# Altium footprint library ICL_passives_v1.PcbLib: 102 footprints (part 4 of 7)
Each footprint in its own frame and in the unit in brackets; x right, y up, seen from the top. Pads: shape width x height; smd on the part's side, far side on the other; paste and mask are expansions set on the pad; w line width, h text height; cw(c..) or ccw(c..) is an arc to the next point about the centre after c.
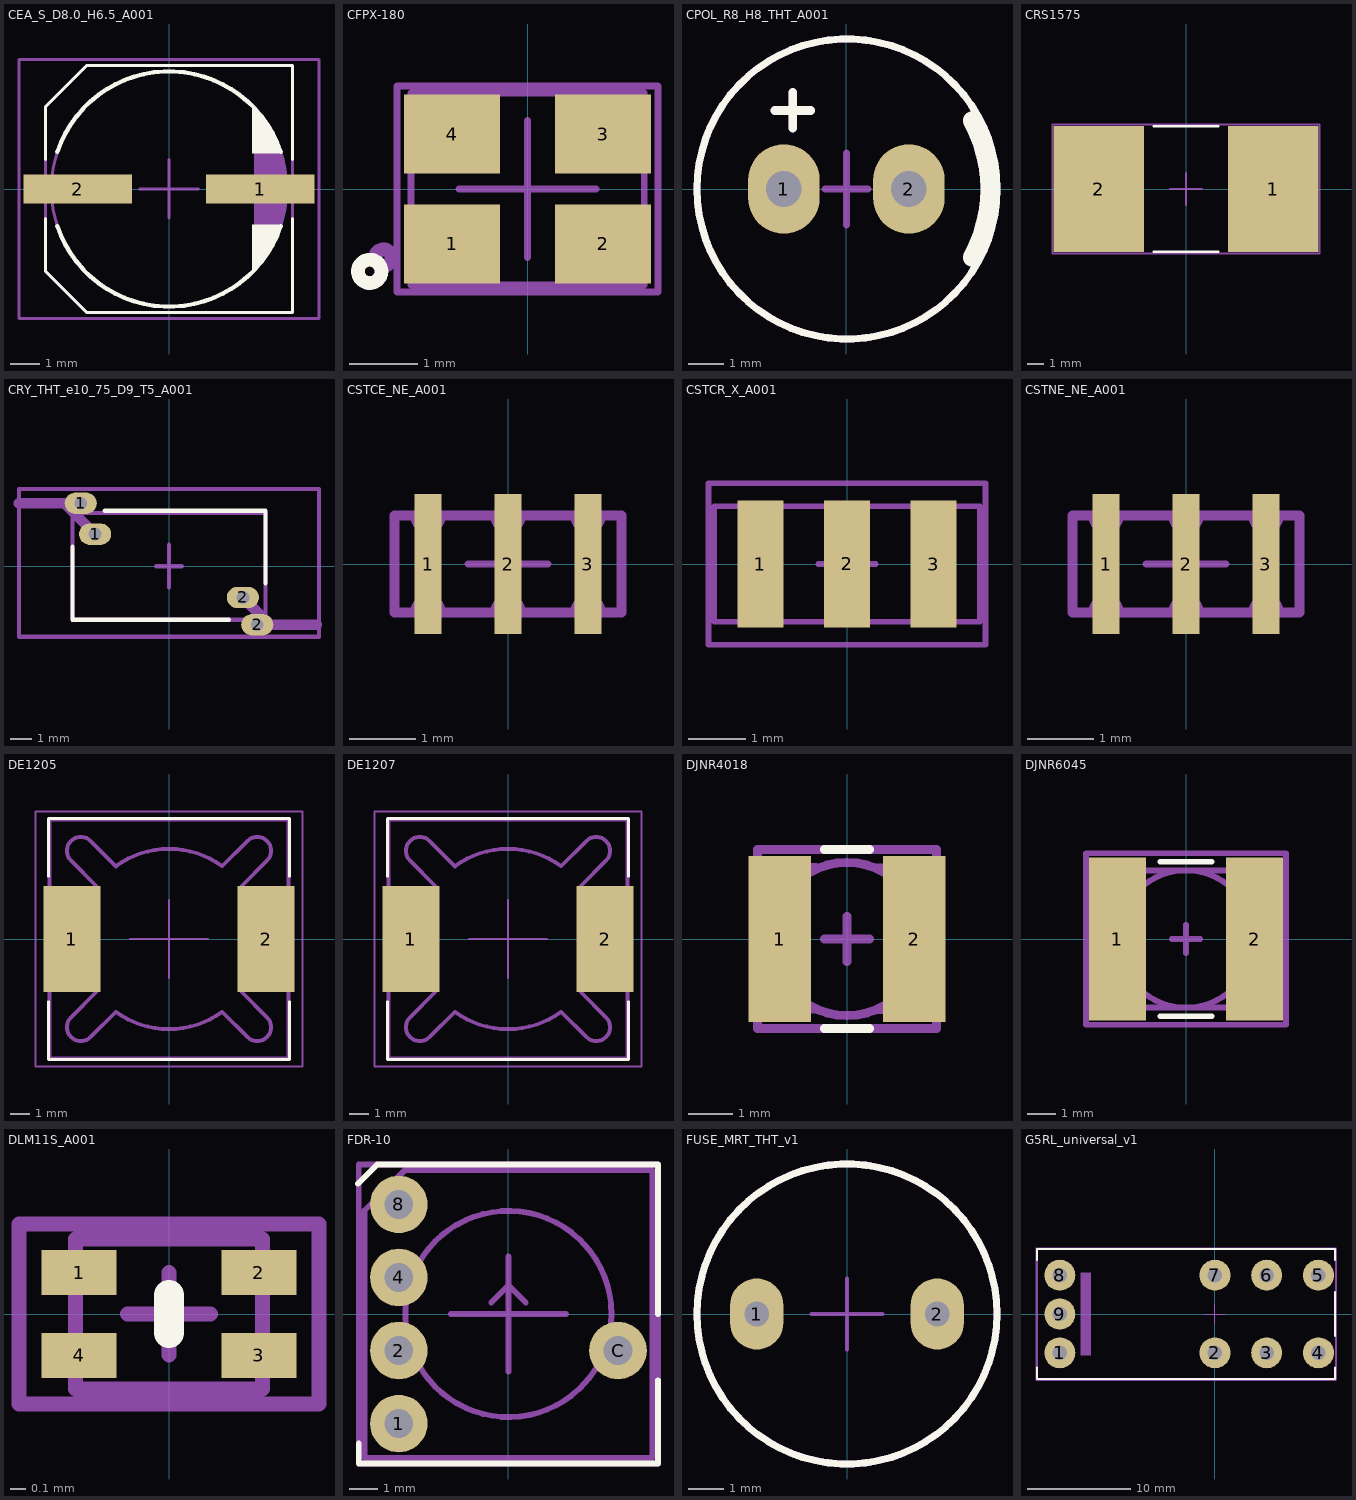
[diagram p3: the footprints below, top view; thin cyan lines are the x and y axes]

## CEA_S_D8.0_H6.5_A001 [mm]
pads (2):
  rect 3.7x1 smd: 1(3.1,0) 2(-3.1,0)
Top Overlay:
  region: 2.825,-2.827 3.346,-2.221 3.392,-2.176 3.475,-2.078 3.549,-1.973 3.611,-1.861 3.637,-1.802 3.677,-1.735 3.741,-1.591 3.789,-1.442 3.821,-1.289 3.828,-1.211 2.825,-1.211 2.825,-1.335
  region: 2.83,2.832 3.298,2.298 3.386,2.196 3.539,1.976 3.669,1.74 3.773,1.492 3.811,1.363 3.813,1.345 3.816,1.307 3.817,1.269 3.817,1.232 3.816,1.213 2.83,1.213
  lines w0.1: -4.2,-1 -4.2,-2.8 -2.8,-4.2 4.2,-4.2 4.2,-1 ; -4.2,1 -4.2,2.8 -2.8,4.2 4.2,4.2 4.2,1
  lines w0.15: -3.795,-1.265 ccw(c0,0) 3.795,-1.265 ; -3.795,1.265 cw(c0,0) 3.795,1.265
Top M11-12_SMOT:
  circle w0.1: c0,0 r4
  rectangle: -4.8,-0.4 -4.2,0.417
  region: 4.8,0.417 3.833,0.417 3.833,-0.416 4.8,-0.416
  region: 2.9,2.8 3.256,2.3 3.342,2.204 3.493,1.997 3.623,1.777 3.731,1.544 3.774,1.423 3.828,1.296 3.911,1.032 3.968,0.761 3.998,0.486 4,0.348 4,-0.148 4.005,-0.282 3.99,-0.55 3.948,-0.815 3.88,-1.075 3.833,-1.201 3.792,-1.337 3.683,-1.601 3.549,-1.852 3.39,-2.09 3.3,-2.2 2.9,-2.7
  lines w0.1: -4.2,-2.8 -2.8,-4.2 4.2,-4.2 4.2,4.2 -2.8,4.2 -4.2,2.8 -4.2,-2.8
Top M13-14_SDES:
  text "'.Designator'" at 0.417,-5.665 h1
Top M15-16_SORG:
  lines w0.1: -0.995,0 0.005,0 ; 0,-0.989 0,0.011 ; 0,0 1,0 ; 0.003,0.008 0.003,1.008 ; -5.1,-4.4 5.1,-4.4 5.1,4.4 -5.1,4.4 -5.1,-4.4
3D body "CEA_S_D8_H6_5_A001.stp": height 6.52, standoff 0.01, extent -4.95,-4.15 4.95,4.15

## CFPX-180 [mm] "kwarc"
pads (4):
  rect 1.4x1.15 smd: 1(-1.1,-0.8) 2(1.1,-0.8) 3(1.1,0.8) 4(-1.1,0.8)
Top Overlay:
  circle w0.2: c-2.3,-1.2 r0.17
Top M11-12_SMOT:
  circle w0.2: c-2.1,-1 r0.12
  rectangle: 0.7,0.5 1.7,1.4
  region: 1.7,-0.5 0.7,-0.5 0.7,-1.4 1.7,-1.4
  rectangle: -1.7,0.5 -0.7,1.4
  region: -0.7,-0.5 -1.7,-0.5 -1.7,-1.4 -0.7,-1.4
  lines w0.1: -1.7,-1.4 1.7,-1.4 1.7,1.4 -1.7,1.4 -1.7,-1.4
Top M13-14_SDES:
  text "'.Designator'" at -4.532,1.967 h0.8
Top M15-16_SORG:
  lines w0.1: -1,0 0,0 ; 0,-1 0,0 ; 0,1 0,0 ; 1,0 0,0 ; -1.9,-1.5 1.9,-1.5 1.9,1.5 -1.9,1.5 -1.9,-1.5
3D body: height 0.6, standoff 0, extent -1.7,-1.4 1.7,1.4
3D body: height 0.8, standoff 0.6, extent -1.6,-1.3 1.6,1.3

## CPOL_R8_H8_THT_A001 [mm] "polimer l=8.0mm fi= 8mm e=3.5"
pads (2):
  oval 2x2.5 hole 1: 1(-1.75,0) 2(1.75,0)
Top Overlay:
  circle w0.2: c0.018,0 r4.2
  lines w0.25: -2,2.2 -1,2.2 ; -1.5,1.7 -1.5,2.7
  lines w0.5: 3.512,-1.915 ccw(c0,0) 3.512,1.915
Top M15-16_SORG:
  lines w0.2: -0.6,0 0.6,0 ; 0,-1 0,1
Top M17-18_TDES:
  text "'.Designator'" at 0.417,-5.665 h1
Top M19-20_TMOT:
  circle w0.2: c0.018,0 r4.2
  lines w0.25: -2,2.2 -1,2.2 ; -1.5,1.7 -1.5,2.7
  lines w0.5: 3.512,-1.915 ccw(c0,0) 3.512,1.915
3D body "CPOL_R8_H8_THT_A001.stp": height 9.01, standoff -2.49, extent -4.25,-4.25 4.25,4.245

## CRS1575 [mm]
pads (2):
  rect 5.6x7.8 smd: 1(5.4,0) 2(-5.4,0)
Top Overlay:
  lines w0.152: -2,-3.9 2,-3.9 ; -2,3.9 2,3.9
Top M11-12_SMOT:
  lines w0.1: -8.3,-4 -8.3,4 8.3,4 8.3,-4 -8.3,-4
Top M13-14_SDES:
  text "'.Designator'" at 0.417,-5.665 h1
Top M15-16_SORG:
  lines w0.1: -0.995,0 0.005,0 ; 0,-0.989 0,0.011 ; 0,0 1,0 ; 0.003,0.008 0.003,1.008 ; -8.3,-4 -8.3,4 8.3,4 8.3,-4 -8.3,-4
3D body "CRS1575.stp": height 1.81, standoff 0.01, extent -7.6,-3.75 7.6,3.75

## CRY_THT_e10_75_D9_T5_A001 [mm] "cr e=7.5-10 D=7.5 T=4 THT"
pads (4):
  oval 1.5x1 hole 0.6: 1(-4.119,2.935) 1(-3.447,1.493) 2(3.447,-1.462) 2(4.119,-2.735)
Top Overlay:
  lines w0.2: -4.5,0.9 -4.5,-2.5 2.8,-2.5 ; -3,2.581 4.5,2.581 4.5,-0.8
Top M15-16_SORG:
  lines w0.2: -0.6,0 0.6,0 ; 0,-1 0,1 ; -7,-3.3 -7,3.6 7,3.6 7,-0.8 7,-3.3 -7,-3.3
Top M17-18_TDES:
  text "'.Designator'" at -5.165,-0.517 h1
Top M19-20_TMOT:
  circle w0.35: c3.447,-1.462 r0.2
  circle w0.35: c-3.447,1.493 r0.2
  circle w0.35: c4.119,-2.735 r0.2
  circle w0.35: c-4.119,2.935 r0.2
  lines w0.2: -4.5,-2.5 4.5,-2.5 4.5,2.482 -4.5,2.482 -4.5,-2.5
  lines w0.5: -4.119,2.935 -7,2.935 -4.889,2.935 -3.447,1.493 ; 3.447,-1.462 4.72,-2.735 6.9,-2.735 4.119,-2.735
3D body "e=75.stp": height 7.35, standoff -2.49, extent -3.861,-2.485 3.862,2.52
3D body "e=10mm.stp": height 11.99, standoff -2.5, extent -6.942,-3.335 6.942,3.535

## CSTCE_NE_A001 [mm] "Murata ceramic resonator e=1,2mm"
pads (3):
  rect 0.4x2.1 smd: 1(-1.2,0) 2(0,0) 3(1.2,0)
Top M11-12_SMOT:
  lines w0.1: -1.409,-0.689 cw(c-1.2,-0.71) -0.991,-0.69 ; -1.409,0.69 ccw(c-1.2,0.71) -0.991,0.689 ; -0.209,-0.689 cw(c0,-0.71) 0.209,-0.69 ; -0.209,0.69 ccw(c0,0.71) 0.209,0.689 ; 0.991,-0.689 cw(c1.2,-0.71) 1.409,-0.69 ; 0.991,0.69 ccw(c1.2,0.71) 1.409,0.689
  lines w0.15: -1.7,0.71 -1.7,-0.73 1.7,-0.73 1.7,0.73 -1.7,0.73
Top M13-14_SDES:
  text "'.Designator'" at -3.399,-0.25 h0.6
Top M15-16_SORG:
  lines w0.05: -1.7,0.71 -1.7,-0.73 1.7,-0.73 1.7,0.73 -1.7,0.73
  lines w0.1: -0.6,0 0,0 ; 0,-0.6 0,0 ; 0,0.6 0,0 ; 0.6,0 0,0
3D body: height 0.4, standoff 0, extent -1.7,-0.7 1.7,0.7
3D body: height 0.7, standoff 0.4, extent -1.5,-0.5 1.5,0.5

## CSTCR_X_A001 [mm]
height 0.381
pads (3):
  rect 0.8x2.2 smd: 1(-1.5,0) 2(0,0) 3(1.5,0)
Top M11-12_SMOT:
  lines w0.1: -2.3,-1 -2.3,1 2.3,1 2.3,-1 -2.3,-1
Top M13-14_SDES:
  text "'.Designator'" at -3.399,1.65 h0.6
Top M15-16_SORG:
  lines w0.1: -0.5,0 0.5,0 ; 0,-0.5 0,0.5 ; -2.4,-1.4 -2.4,1.4 2.4,1.4 2.4,-1.4 -2.4,-1.4
3D body: height 0.4, standoff 0.01, extent -2.3,-1 2.3,1
3D body: height 1.15, standoff 0.4, extent -2.1,-0.7 2.1,0.7

## CSTNE_NE_A001 [mm] "Murata ceramic resonator e=1,2mm"
pads (3):
  rect 0.4x2.1 smd: 1(-1.2,0) 2(0,0) 3(1.2,0)
Top M11-12_SMOT:
  lines w0.1: -1.409,-0.689 cw(c-1.2,-0.71) -0.991,-0.69 ; -1.409,0.69 ccw(c-1.2,0.71) -0.991,0.689 ; -0.209,-0.689 cw(c0,-0.71) 0.209,-0.69 ; -0.209,0.69 ccw(c0,0.71) 0.209,0.689 ; 0.991,-0.689 cw(c1.2,-0.71) 1.409,-0.69 ; 0.991,0.69 ccw(c1.2,0.71) 1.409,0.689
  lines w0.15: -1.7,0.71 -1.7,-0.73 1.7,-0.73 1.7,0.73 -1.7,0.73
Top M13-14_SDES:
  text "'.Designator'" at -3.399,-0.25 h0.6
Top M15-16_SORG:
  lines w0.05: -1.7,0.71 -1.7,-0.73 1.7,-0.73 1.7,0.73 -1.7,0.73
  lines w0.1: -0.6,0 0,0 ; 0,-0.6 0,0 ; 0,0.6 0,0 ; 0.6,0 0,0
3D body: height 0.4, standoff 0, extent -1.7,-0.7 1.7,0.7
3D body: height 0.7, standoff 0.4, extent -1.5,-0.5 1.5,0.5

## DE1205 [mm]
pads (2):
  rect 2.9x5.4 smd: 1(-4.95,0) 2(4.95,0)
Top Overlay:
  lines w0.152: -6.15,-3.2 -6.15,-6.15 6.15,-6.15 6.15,-3.2 ; -6.15,3.2 -6.15,6.15 6.15,6.15 6.15,3.2
Top M11-12_SMOT:
  rectangle: 5.1,-2.5 6.1,2.5
  region: -5.1,2.5 -6.1,2.5 -6.1,-2.5 -5.1,-2.5
  lines w0.1: -3.716,2.712 -3.7,2.696
  lines w0.2: -3.716,-2.712 cw(c0,0) -3.716,2.712 -3.716,2.716 -5,4 cw(c-4.5,4.5) -4,5 -2.7,3.7 ; -3.714,-2.714 -5,-4 ccw(c-4.5,-4.5) -4,-5 -2.714,-3.714 ; -2.712,-3.716 ccw(c0,0) 2.712,-3.716 ; -2.712,3.716 cw(c0,0) 2.712,3.716 ; 2.714,-3.714 4,-5 ccw(c4.5,-4.5) 5,-4 3.714,-2.714 ; 2.714,3.714 4,5 cw(c4.5,4.5) 5,4 3.714,2.714 ; 3.716,-2.712 ccw(c0,0) 3.716,2.712 ; -6.1,-6.1 6.1,-6.1 6.1,6.1 -6.1,6.1 -6.1,-6.1
Top M13-14_SDES:
  text "'.Designator'" at 0.5,-6.798 h1.2
Top M15-16_SORG:
  lines w0.1: -2,0 0,0 ; 0,-2 0,0 ; 0,2 0,0 ; 2,0 0,0 ; -6.8,-6.5 6.8,-6.5 6.8,2.3 6.8,6.5 -6.8,6.5 -6.8,-6.5
3D body "DE1207.STEP": height 8, standoff 0, extent -6.077,-6.15 6.223,6.15

## DE1207 [mm]
pads (2):
  rect 2.9x5.4 smd: 1(-4.95,0) 2(4.95,0)
Top Overlay:
  lines w0.152: -6.15,-3.2 -6.15,-6.15 6.15,-6.15 6.15,-3.2 ; -6.15,3.2 -6.15,6.15 6.15,6.15 6.15,3.2
Top M11-12_SMOT:
  rectangle: 5.1,-2.5 6.1,2.5
  region: -5.1,2.5 -6.1,2.5 -6.1,-2.5 -5.1,-2.5
  lines w0.1: -3.716,2.712 -3.7,2.696
  lines w0.2: -3.716,-2.712 cw(c0,0) -3.716,2.712 -3.716,2.716 -5,4 cw(c-4.5,4.5) -4,5 -2.7,3.7 ; -3.714,-2.714 -5,-4 ccw(c-4.5,-4.5) -4,-5 -2.714,-3.714 ; -2.712,-3.716 ccw(c0,0) 2.712,-3.716 ; -2.712,3.716 cw(c0,0) 2.712,3.716 ; 2.714,-3.714 4,-5 ccw(c4.5,-4.5) 5,-4 3.714,-2.714 ; 2.714,3.714 4,5 cw(c4.5,4.5) 5,4 3.714,2.714 ; 3.716,-2.712 ccw(c0,0) 3.716,2.712 ; -6.1,-6.1 6.1,-6.1 6.1,6.1 -6.1,6.1 -6.1,-6.1
Top M13-14_SDES:
  text "'.Designator'" at 0.5,-6.798 h1.2
Top M15-16_SORG:
  lines w0.1: -2,0 0,0 ; 0,-2 0,0 ; 0,2 0,0 ; 2,0 0,0 ; -6.8,-6.5 6.8,-6.5 6.8,2.3 6.8,6.5 -6.8,6.5 -6.8,-6.5
3D body "DE1207.STEP": height 8, standoff 0, extent -6.077,-6.15 6.223,6.15

## DJNR4018 [mm]
pads (2):
  rect 1.4x3.7 smd mask+0: 1(-1.5,0) 2(1.5,0)
Top Overlay:
  lines w0.2: -0.5,-2 0.5,-2 ; -0.5,2 0.5,2
Top M11-12_SMOT:
  circle w0.2: c0,0 r1.709
  lines w0.2: -0.7,-1.559 -1.9,-1.559 -1.9,1.6 -0.7,1.6 ; 0.69,-1.571 1.89,-1.571 1.89,1.587 0.69,1.587
Top M13-14_SDES:
  text "'.Designator'" at 0.333,-4.532 h0.8
Top M15-16_SORG:
  lines w0.2: -0.5,0 0.5,0 ; 0,-0.5 0,0.5 ; -2,-2 2,-2 2,2 -2,2 -2,-2
3D body: height 0.3, standoff 0, extent -1.4,-1.8 1.4,1.8
3D body: height 1.8, standoff 0.3, extent -1.394,-1.397 1.395,1.397
3D body: height 1.8, standoff 1.5, extent -2,-2 2,2
3D body: height 0.3, standoff 0, extent 1.4,-1.6 2,1.6
3D body: height 0.3, standoff 0, extent -2,-1.6 -1.4,1.6

## DJNR6045 [mm]
pads (2):
  rect 2x5.7 smd mask+0: 1(-2.4,0) 2(2.4,0)
Top Overlay:
  lines w0.2: -0.9,-2.7 0.9,-2.7 ; -0.9,2.7 0.9,2.7
Top M11-12_SMOT:
  circle w0.2: c0,0 r2.4
  lines w0.2: -2.9,-2.4 -2.9,2.4 2.9,2.4 2.9,-2.4 -2.9,-2.4
Top M13-14_SDES:
  text "'.Designator'" at -4.532,-0.333 h0.8
Top M15-16_SORG:
  lines w0.2: -0.5,0 0.5,0 ; 0,-0.5 0,0.5 ; -3.5,-3 3.5,-3 3.5,3 -3.5,3 -3.5,-3
3D body: height 0.55, standoff 0, extent -2.81,-2.5 -1.91,2.5
3D body: height 0.5, standoff 0, extent -2.81,-2.8 2.8,2.8
3D body: height 0.55, standoff 0, extent 1.9,-2.5 2.8,2.5
3D body: height 4, standoff 0.5, extent -2.005,-2 1.995,2
3D body: height 4.5, standoff 4, extent -2.805,-2.8 2.795,2.8

## DLM11S_A001 [mm] "murata CM smd choke"
height 0.37
pads (4):
  rect 0.5x0.3 smd: 1(-0.6,0.275) 2(0.6,0.275) 3(0.6,-0.275) 4(-0.6,-0.275)
Top Overlay:
  lines w0.2: 0,-0.125 0,0.125
Top M11-12_SMOT:
  rectangle: -0.625,0.17 -0.485,0.4
  rectangle: -0.625,-0.38 -0.485,-0.15
  region: 0.625,0.38 0.485,0.38 0.485,0.15 0.625,0.15
  region: 0.625,-0.17 0.485,-0.17 0.485,-0.4 0.625,-0.4
  lines w0.1: -0.625,-0.5 0.625,-0.5 0.625,0.5 -0.625,0.5 -0.625,-0.5
Top M13-14_SDES:
  text "'.Designator'" at 0.125,-1.699 h0.3
Top M15-16_SORG:
  lines w0.1: -0.275,0 0.275,0 ; 0,-0.275 0,0.275 ; -1,-0.6 1,-0.6 1,0.6 -1,0.6 -1,-0.6
3D body "DLM11SN450HZ2L--3DModel-STEP-1.STEP": height 0.61, standoff 0.01, extent -0.625,-0.5 0.625,0.5

## FDR-10 [mm] "rotary dip switch"
pads (5):
  round 2 hole 1 paste+0 mask+0.05: 1(-3.81,-3.81) 2(-3.81,-1.27) 4(-3.81,1.27) 8(-3.81,3.81) C(3.81,-1.27)
Top Overlay:
  lines w0.2: -5.228,4.528 -4.557,5.2 5.2,5.2 5.2,0 ; -5.2,-4.5 -5.2,-5.2 5.2,-5.2 5.2,-2.3
Top M15-16_SORG:
  lines w0.2: -2,0 0,0 ; 0,-2 0,0 ; 0,2 0,0 ; 2,0 0,0 ; -5.2,-5.2 -5.2,5.2 5.2,5.2 5.2,-5.2 -5.2,-5.2
Top M17-18_TDES:
  text "'.Designator'" at 0.417,-5.665 h1
Top M19-20_TMOT:
  circle w0.2: c0,0 r3.585
  lines w0.2: 0,-0.9 0,1 ; 0.6,0.4 0,1 ; -0.6,0.4 -0.6,0.4 ; -0.6,0.4 0,1 ; -5,-5 -5,3.6 -3.6,5 5,5 5,-5 -5,-5
  text "9" at -1.561,1.28 h1.2
  text "8" at -1.953,0.034 h1.2
  text "7" at -1.706,-0.795 h1.2
  text "6" at -0.824,-1.75 h1.2
  text "5" at 0.4,-1.9 h1.2
  text "4" at 1.471,-1.28 h1.2
  text "3" at 1.853,-0.334 h1.2
  text "2" at 1.706,1.095 h1.2
  text "1" at 0.886,1.732 h1.2
  text "0" at 0.3,3.1 h1.2
3D body "FDR-10.STEP": height 6.61, standoff -3.79, extent -5,-5 5,5

## FUSE_MRT_THT_v1 [mm] "MRT round fuse THT soldering"
pads (2):
  oval 1.5x2 hole 0.7 mask+0.1: 1(-2.54,0) 2(2.54,0)
Top Overlay:
  circle w0.2: c0,0 r4.225
Top M15-16_SORG:
  circle w0.1: c0,0 r4.225
  lines w0.1: -1,0 0,0 ; 0,-1 0,0 ; 0,1 0,0 ; 1,0 0,0
Top M17-18_TDES:
  text "'.Designator'" at 0.417,-5.665 h1
Top M19-20_TMOT:
  circle w0.2: c0,0 r4.225
  lines w0.1: -2.892,-0.343 -2.192,0.357 ; -2.892,-0.343 -2.892,0.357 ; -2.892,-0.343 -2.192,-0.343 ; -2.892,0.357 -2.192,-0.343 ; -2.892,0.357 -2.192,0.357 ; -2.192,-0.343 -2.192,0.357 ; 2.25,-0.35 2.95,0.35 ; 2.25,-0.35 2.25,0.35 ; 2.25,-0.35 2.95,-0.35 ; 2.25,0.35 2.95,-0.35 ; 2.25,0.35 2.95,0.35 ; 2.95,-0.35 2.95,0.35
3D body "MRT_x_260001.step": height 7.91, standoff -3.16, extent -4.225,-4.225 4.225,4.225

## G5RL_universal_v1 [mm] "G5RL universal footprint"
pads (9):
  round 3 hole 1.4 paste+0 mask+0.05: 1(-15,-3.75) 2(0,-3.75) 3(5,-3.75) 4(10,-3.75) 5(10,3.75) 6(5,3.75) 7(0,3.75) 8(-15,3.75) 9(-15,0)
Top Overlay:
  lines w0.2: -17.2,-5.167 -17.2,-6.267 11.6,-6.267 11.6,-5.169 ; -17.2,5.202 -17.2,6.3 11.6,6.3 11.6,5.2 ; 11.6,-2.1 11.6,2.1
Top M15-16_SORG:
  lines w0.1: -1,0 0,0 ; 0,-1 0,0 ; 0,1 0,0 ; 1,0 0,0 ; -17.3,-6.4 -17.3,6.4 11.7,6.4 11.7,-6.4 -10.9,-6.4 -17.3,-6.4
Top M17-18_TDES:
  text "'.Designator'" at -11.23,-0.733 h2
Top M19-20_TMOT:
  rectangle: -13,-4 -12,4
  lines w0.2: -17.2,-6.3 11.7,-6.3 11.7,6.3 -17.2,6.3 -17.2,-6.3
3D body "g5rl-k1-e.STEP": height 15.71, standoff -3.49, extent -17.3,-6.35 11.7,6.35